# Altium footprint library Footprints.PcbLib: 45 footprints (part 3 of 3)
Each footprint in its own frame and in the unit in brackets; x right, y up, seen from the top. Pads: shape width x height; smd on the part's side, far side on the other; paste and mask are expansions set on the pad; w line width, h text height; cw(c..) or ccw(c..) is an arc to the next point about the centre after c.
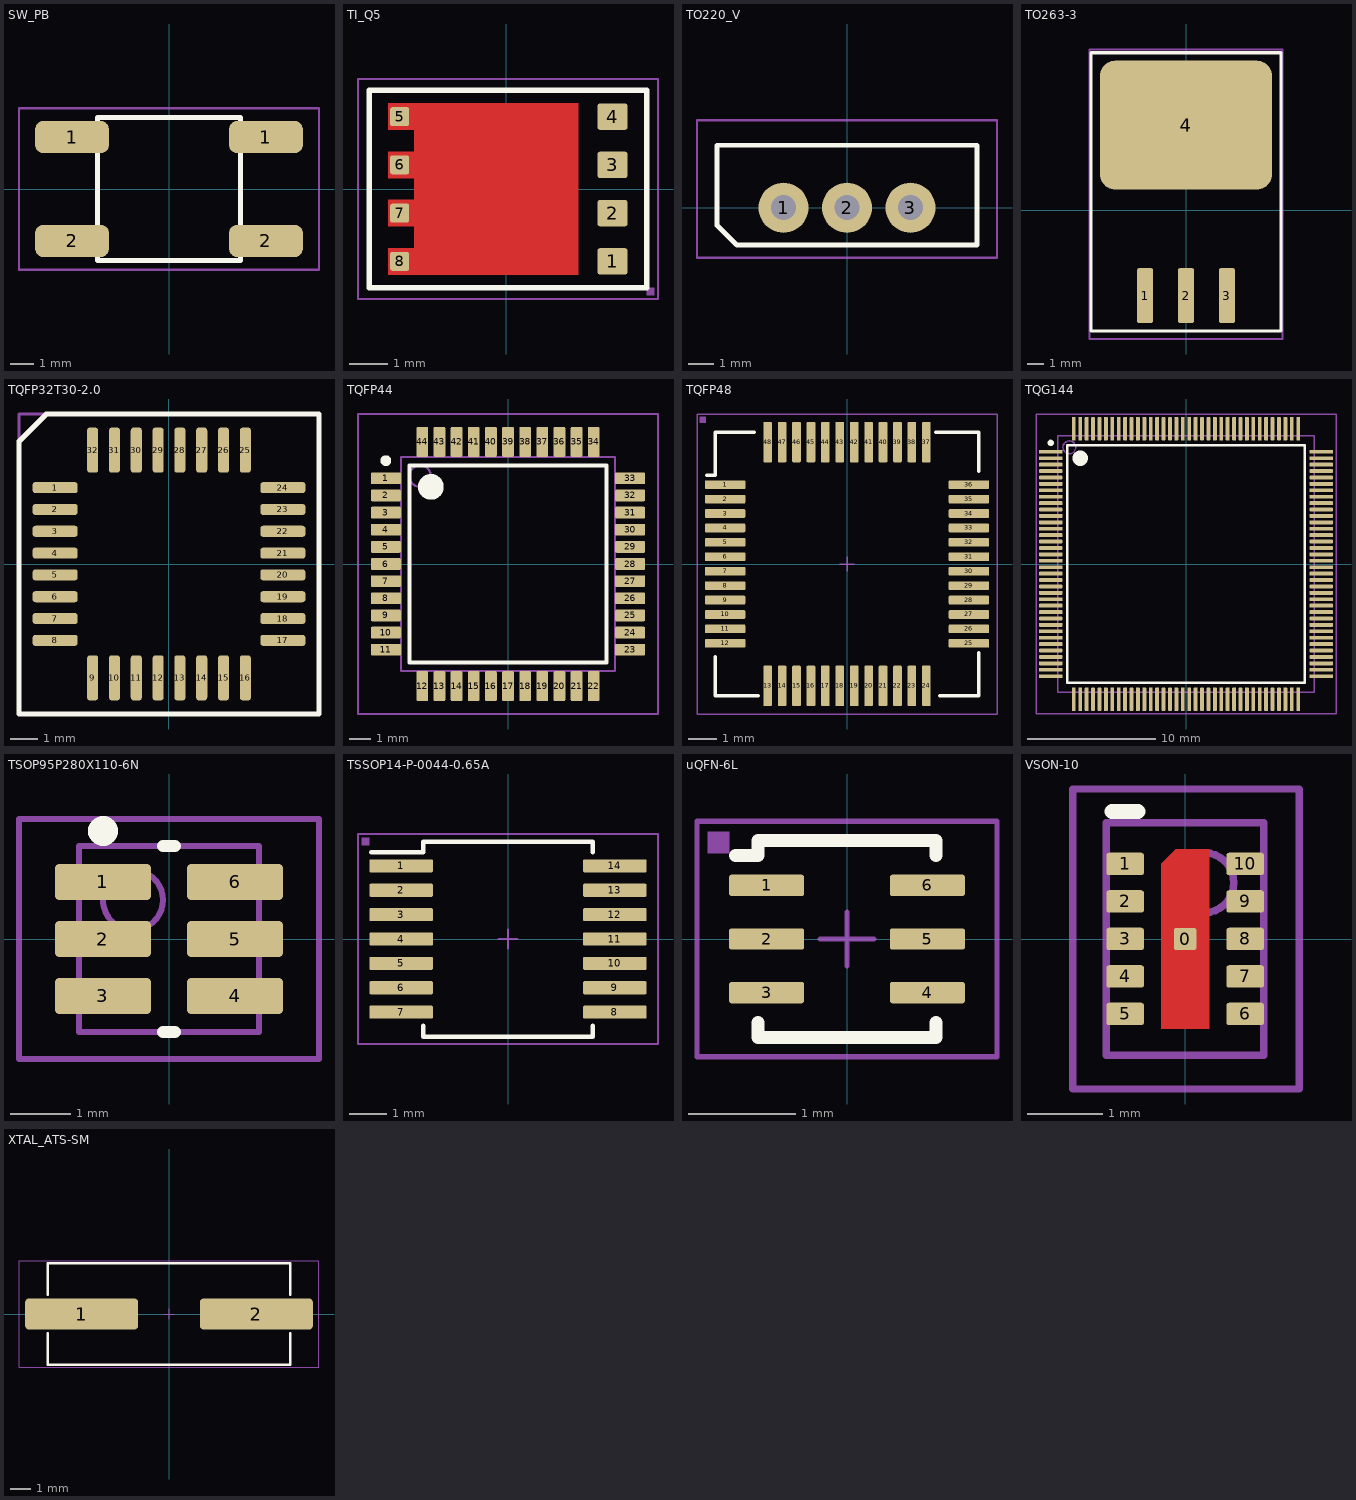
[diagram p2: the footprints below, top view; thin cyan lines are the x and y axes]

## SW_PB [mm]
pads (4):
  rrect50% 3.2x1.4 smd: 1(-4.2,2.25) 1(4.2,2.25) 2(-4.2,-2.25) 2(4.2,-2.25)
Top Overlay:
  lines w0.2: -3.1,-3.1 3.1,-3.1 3.1,3.1 -3.1,3.1 -3.1,-3.1
15. Courtyard TOP:
  lines w0.1: -6.5,-3.5 -6.5,3.5 6.5,3.5 6.5,-3.5 -6.5,-3.5
  text ".designator" at -1.5,-0.5 h1.5
  text "." at -2.4,2.2 h1
3D body: height 4.3, standoff 0, extent -1.488,-1.497 1.5,1.497
3D body: height 2.6, standoff 0, extent -3.1,-3.1 3.1,3.1

## TI_Q5 [mm] "Mosfet package"
pads (8):
  rrect23% 0.8x0.7 smd: 1(2.803,-1.905) 3(2.803,0.635) 4(2.803,1.905)
  rrect23% 0.8x0.7 smd paste+0: 2(2.803,-0.635)
  rrect23% 0.5x0.5 smd: 5(-2.802,1.905) 6(-2.802,0.635) 7(-2.802,-0.635) 8(-2.802,-1.905)
Top Layer:
  region: 1.898,2.255 1.898,-2.255 -3.102,-2.255 -3.102,-1.555 -2.422,-1.555 -2.422,-0.985 -3.102,-0.985 -3.102,-0.285 -2.422,-0.285 -2.422,0.285 -3.102,0.285 -3.102,0.985 -2.422,0.985 -2.422,1.555 -3.102,1.555 -3.102,2.255
Top Overlay:
  lines w0.15: -3.6,-2.6 3.7,-2.6 3.7,2.6 -3.6,2.6 -3.6,-2.6
15. Courtyard TOP:
  lines w0.05: -0.25,0 0.25,0 ; 0,-0.25 0,0.25 ; -3.9,-2.9 4,-2.9 4,2.9 -3.9,2.9 -3.9,-2.9
18. Assembly TOP:
  region: 3.9,-2.8 3.7,-2.8 3.7,-2.6 3.9,-2.6
  lines w0.05: -3.9,-2.9 -3.9,2.9 4,2.9 4,-2.9 -3.9,-2.9
  text ".designator" at -3.4,-0.7 h1.5
3D body: height 1.5, standoff 0, extent -3.5,-2.5 3.6,2.5

## TO220_V [mm]
height 16
pads (3):
  round 2 hole 1: 1(-2.54,0) 2(0,0) 3(2.54,0)
Top Overlay:
  lines w0.2: -5.2,-0.7 -4.4,-1.5 5.2,-1.5 5.2,2.5 -5.2,2.5 -5.2,-0.7
15. Courtyard TOP:
  lines w0.1: -6,-2 6,-2 6,3.5 -6,3.5 -6,-2
  text ".designator" at -1.6,0.1 h1
  text "." at -5.5,-1.5 h1
3D body: height 19.33, standoff -10, extent -5.607,-1.5 5.607,3.19

## TO263-3 [mm]
pads (4):
  rrect23% 1x3.4 smd: 1(-2.54,-5.3) 2(0,-5.3) 3(2.54,-5.3)
  rrect23% 10.7x8 smd: 4(0,5.3)
Top Overlay:
  lines w0.2: -5.9,-7.5 -5.9,9.8 5.9,9.8 5.9,-7.5 -3.1,-7.5 -5.9,-7.5
15. Courtyard TOP:
  lines w0.1: -6,-8 6,-8 6,10 -6,10 -6,-8
  text ".designator" at -0.5,0 h0.5
  text "." at -5,-7 h0.5

## TQFP32T30-2.0 [mm]
height 1.2
pads (32):
  rrect50% 1.65x0.406 smd: 1(-4.175,2.8) 2(-4.175,2) 3(-4.175,1.2) 4(-4.175,0.4) 5(-4.175,-0.4) 6(-4.175,-1.2) 7(-4.175,-2) 8(-4.175,-2.8) 17(4.175,-2.8) 18(4.175,-2) 19(4.175,-1.2) 20(4.175,-0.4) 21(4.175,0.4) 22(4.175,1.2) 23(4.175,2) 24(4.175,2.8)
  rrect50% 0.406x1.65 smd: 9(-2.8,-4.175) 10(-2,-4.175) 11(-1.2,-4.175) 12(-0.4,-4.175) 13(0.4,-4.175) 14(1.2,-4.175) 15(2,-4.175) 16(2.8,-4.175) 25(2.8,4.175) 26(2,4.175) 27(1.2,4.175) 28(0.4,4.175) 29(-0.4,4.175) 30(-1.2,4.175) 31(-2,4.175) 32(-2.8,4.175)
Top Overlay:
  lines w0.2: -5.5,-5.5 5.5,-5.5 5.5,5.5 -4.5,5.5 -5.5,4.5 -5.5,-5.5
15. Courtyard TOP:
  lines w0.1: -5.5,-5.5 -5.5,-5.5 ; -5.5,-5.5 -5.5,5.5 5.5,5.5 5.5,-5.5 -5.5,-5.5
  text ".designator" at -1.27,0 h1
  text "." at -4.4,2.7 h1
3D body: height 1.22, standoff 0.02, extent -4.599,-4.599 4.599,4.6

## TQFP44 [mm] "TQFP, 44-Leads, Body 10,00x10,00mm, Pitch 0,80mm, IPC Medium Density"
height 1.2
pads (44):
  rrect23% 1.4x0.55 smd mask+0.07: 1(-5.7,4) 2(-5.7,3.2) 3(-5.7,2.4) 4(-5.7,1.6) 5(-5.7,0.8) 6(-5.7,0) 7(-5.7,-0.8) 8(-5.7,-1.6) 9(-5.7,-2.4) 10(-5.7,-3.2) 11(-5.7,-4) 23(5.7,-4) 24(5.7,-3.2) 25(5.7,-2.4) 26(5.7,-1.6) 27(5.7,-0.8) 28(5.7,0) 29(5.7,0.8) 30(5.7,1.6) 31(5.7,2.4) 32(5.7,3.2) 33(5.7,4)
  rrect23% 0.55x1.4 smd mask+0.07: 12(-4,-5.7) 13(-3.2,-5.7) 14(-2.4,-5.7) 15(-1.6,-5.7) 16(-0.8,-5.7) 17(0,-5.7) 18(0.8,-5.7) 19(1.6,-5.7) 20(2.4,-5.7) 21(3.2,-5.7) 22(4,-5.7) 34(4,5.7) 35(3.2,5.7) 36(2.4,5.7) 37(1.6,5.7) 38(0.8,5.7) 39(0,5.7) 40(-0.8,5.7) 41(-1.6,5.7) 42(-2.4,5.7) 43(-3.2,5.7) 44(-4,5.7)
Top Overlay:
  circle w0.25: c-5.7,4.825 r0.125
  circle w0.6: c-3.6,3.6 r0.3
  lines w0.2: -4.6,-4.6 -4.6,4.6 4.6,4.6 4.6,-4.6 -4.6,-4.6
13. 3D Model TOP:
  circle w0.1: c-4.1,4.1 r0.5
  lines w0.1: -5,-5 -5,5 5,5 5,-5 -5,-5
15. Courtyard TOP:
  lines w0.1: -7,-7 -7,7 7,7 7,-7 -7,-7
  text ".designator" at -1.5,-0.5 h1
3D body: height 1.2, standoff 0.15, extent -5,-5 5,5

## TQFP48 [mm]
height 1.2
pads (48):
  rrect23% 1.4x0.3 smd mask+0.05: 1(-4.225,2.75) 2(-4.225,2.25) 3(-4.225,1.75) 4(-4.225,1.25) 5(-4.225,0.75) 6(-4.225,0.25) 7(-4.225,-0.25) 8(-4.225,-0.75) 9(-4.225,-1.25) 10(-4.225,-1.75) 11(-4.225,-2.25) 12(-4.225,-2.75) 25(4.225,-2.75) 26(4.225,-2.25) 27(4.225,-1.75) 28(4.225,-1.25) 29(4.225,-0.75) 30(4.225,-0.25) 31(4.225,0.25) 32(4.225,0.75) 33(4.225,1.25) 34(4.225,1.75) 35(4.225,2.25) 36(4.225,2.75)
  rrect23% 0.3x1.4 smd mask+0.05: 13(-2.75,-4.225) 14(-2.25,-4.225) 15(-1.75,-4.225) 16(-1.25,-4.225) 17(-0.75,-4.225) 18(-0.25,-4.225) 19(0.25,-4.225) 20(0.75,-4.225) 21(1.25,-4.225) 22(1.75,-4.225) 23(2.25,-4.225) 24(2.75,-4.225) 37(2.75,4.225) 38(2.25,4.225) 39(1.75,4.225) 40(1.25,4.225) 41(0.75,4.225) 42(0.25,4.225) 43(-0.25,4.225) 44(-0.75,4.225) 45(-1.25,4.225) 46(-1.75,4.225) 47(-2.25,4.225) 48(-2.75,4.225)
Top Overlay:
  lines w0.12: -4.87,3.08 -4.56,3.08 -4.56,4.56 -3.21,4.56 ; -4.56,-3.21 -4.56,-4.56 -3.08,-4.56 ; 3.08,4.56 4.56,4.56 4.56,3.21 ; 3.21,-4.56 4.56,-4.56 4.56,-3.08
15. Courtyard TOP:
  lines w0.05: -0.25,0 0.25,0 ; 0,-0.25 0,0.25 ; -5.2,-5.2 -5.2,5.2 5.2,5.2 5.2,-5.2 -5.2,-5.2
18. Assembly TOP:
  region: -5.1,5.1 -4.9,5.1 -4.9,4.9 -5.1,4.9
  lines w0.05: -5.2,-5.2 5.2,-5.2 5.2,5.2 -5.2,5.2 -5.2,-5.2
  text ".designator" at -3.4,-0.7 h1.5
3D body: height 1.48, standoff 0.02, extent -4.5,-4.5 4.5,4.5

## TQG144 [mm] "Thin QFP, 144-Leads, Body 20x20mm, Pitch 0.5mm, IPC Medium Density"
height 1.6
pads (144):
  rrect23% 1.8x0.3 smd mask+0.07: 1(-10.55,8.75) 2(-10.55,8.25) 3(-10.55,7.75) 4(-10.55,7.25) 5(-10.55,6.75) 6(-10.55,6.25) 7(-10.55,5.75) 8(-10.55,5.25) 9(-10.55,4.75) 10(-10.55,4.25) 11(-10.55,3.75) 12(-10.55,3.25) 13(-10.55,2.75) 14(-10.55,2.25) 15(-10.55,1.75) 16(-10.55,1.25) 17(-10.55,0.75) 18(-10.55,0.25) 19(-10.55,-0.25) 20(-10.55,-0.75) 21(-10.55,-1.25) 22(-10.55,-1.75) 23(-10.55,-2.25) 24(-10.55,-2.75) 25(-10.55,-3.25) 26(-10.55,-3.75) 27(-10.55,-4.25) 28(-10.55,-4.75) 29(-10.55,-5.25) 30(-10.55,-5.75) 31(-10.55,-6.25) 32(-10.55,-6.75) 33(-10.55,-7.25) 34(-10.55,-7.75) 35(-10.55,-8.25) 36(-10.55,-8.75) 73(10.55,-8.75) 74(10.55,-8.25) 75(10.55,-7.75) 76(10.55,-7.25) 77(10.55,-6.75) 78(10.55,-6.25) 79(10.55,-5.75) 80(10.55,-5.25) 81(10.55,-4.75) 82(10.55,-4.25) 83(10.55,-3.75) 84(10.55,-3.25) 85(10.55,-2.75) 86(10.55,-2.25) 87(10.55,-1.75) 88(10.55,-1.25) 89(10.55,-0.75) 90(10.55,-0.25) 91(10.55,0.25) 92(10.55,0.75) 93(10.55,1.25) 94(10.55,1.75) 95(10.55,2.25) 96(10.55,2.75) 97(10.55,3.25) 98(10.55,3.75) 99(10.55,4.25) 100(10.55,4.75) 101(10.55,5.25) 102(10.55,5.75) 103(10.55,6.25) 104(10.55,6.75) 105(10.55,7.25) 106(10.55,7.75) 107(10.55,8.25) 108(10.55,8.75)
  rrect23% 0.3x1.8 smd mask+0.07: 37(-8.75,-10.55) 38(-8.25,-10.55) 39(-7.75,-10.55) 40(-7.25,-10.55) 41(-6.75,-10.55) 42(-6.25,-10.55) 43(-5.75,-10.55) 44(-5.25,-10.55) 45(-4.75,-10.55) 46(-4.25,-10.55) 47(-3.75,-10.55) 48(-3.25,-10.55) 49(-2.75,-10.55) 50(-2.25,-10.55) 51(-1.75,-10.55) 52(-1.25,-10.55) 53(-0.75,-10.55) 54(-0.25,-10.55) 55(0.25,-10.55) 56(0.75,-10.55) 57(1.25,-10.55) 58(1.75,-10.55) 59(2.25,-10.55) 60(2.75,-10.55) 61(3.25,-10.55) 62(3.75,-10.55) 63(4.25,-10.55) 64(4.75,-10.55) 65(5.25,-10.55) 66(5.75,-10.55) 67(6.25,-10.55) 68(6.75,-10.55) 69(7.25,-10.55) 70(7.75,-10.55) 71(8.25,-10.55) 72(8.75,-10.55) 109(8.75,10.55) 110(8.25,10.55) 111(7.75,10.55) 112(7.25,10.55) 113(6.75,10.55) 114(6.25,10.55) 115(5.75,10.55) 116(5.25,10.55) 117(4.75,10.55) 118(4.25,10.55) 119(3.75,10.55) 120(3.25,10.55) 121(2.75,10.55) 122(2.25,10.55) 123(1.75,10.55) 124(1.25,10.55) 125(0.75,10.55) 126(0.25,10.55) 127(-0.25,10.55) 128(-0.75,10.55) 129(-1.25,10.55) 130(-1.75,10.55) 131(-2.25,10.55) 132(-2.75,10.55) 133(-3.25,10.55) 134(-3.75,10.55) 135(-4.25,10.55) 136(-4.75,10.55) 137(-5.25,10.55) 138(-5.75,10.55) 139(-6.25,10.55) 140(-6.75,10.55) 141(-7.25,10.55) 142(-7.75,10.55) 143(-8.25,10.55) 144(-8.75,10.55)
Top Overlay:
  circle w0.25: c-10.55,9.45 r0.125
  circle w0.6: c-8.25,8.25 r0.3
  lines w0.2: -9.25,-9.25 -9.25,9.25 9.25,9.25 9.25,-9.25 -9.25,-9.25
13. 3D Model TOP:
  circle w0.1: c-9.1,9.1 r0.5
  lines w0.1: -10,-10 -10,10 10,10 10,-10 -10,-10
15. Courtyard TOP:
  lines w0.1: -11.7,-11.7 -11.7,11.7 11.7,11.7 11.7,-11.7 -11.7,-11.7
  text ".designator" at -8.28,-2.362 h5
  text "." at -9.881,9.093 h5
3D body: height 1.6, standoff -0.15, extent -11,-11 11,11

## TSOP95P280X110-6N [mm] "TSOP, 6-Leads, Body 3,00x2,75mm, Pitch 0,95mm, IPC Medium Density"
height 1.1
pads (6):
  rrect23% 1.6x0.6 smd: 1(-1.1,0.95) 2(-1.1,0) 3(-1.1,-0.95) 4(1.1,-0.95) 5(1.1,0) 6(1.1,0.95)
Top Overlay:
  circle w0.25: c-1.1,1.8 r0.125
  lines w0.2: -0.1,-1.55 0.1,-1.55 ; -0.1,1.55 0.1,1.55
15. Courtyard TOP:
  lines w0.1: -2.5,-2 2.5,-2 2.5,2 -2.5,2 -2.5,-2
  text ".designator" at -1.5,-0.5 h1
  text "." at -2,1.5 h1
17. Comp.body:
  circle w0.1: c-0.6,0.65 r0.5
  lines w0.1: -1.5,-1.55 1.5,-1.55 1.5,1.55 -1.5,1.55 -1.5,-1.55
3D body: height 1.1, standoff 0.01, extent -1.5,-1.55 1.5,1.55

## TSSOP14-P-0044-0.65A [mm] "TSSOP, 14-Leads, Body 5.4x4.5mm (max), Pitch 0.65mm, IPC Medium Density"
height 1.2
pads (14):
  rrect23% 1.7x0.35 smd mask+0.1: 1(-2.85,1.95) 2(-2.85,1.3) 3(-2.85,0.65) 4(-2.85,0) 5(-2.85,-0.65) 6(-2.85,-1.3) 7(-2.85,-1.95) 8(2.85,-1.95) 9(2.85,-1.3) 10(2.85,-0.65) 11(2.85,0) 12(2.85,0.65) 13(2.85,1.3) 14(2.85,1.95)
Top Overlay:
  lines w0.12: -3.64,2.31 -2.26,2.31 -2.26,2.6 2.26,2.6 2.26,2.31 ; -2.26,-2.31 -2.26,-2.6 2.26,-2.6 2.26,-2.31
15. Courtyard TOP:
  lines w0.05: -0.25,0 0.25,0 ; 0,-0.25 0,0.25 ; -4,-2.8 -4,2.8 4,2.8 4,-2.8 -4,-2.8
18. Assembly TOP:
  region: -3.9,2.7 -3.7,2.7 -3.7,2.5 -3.9,2.5
  lines w0.05: -4,-2.8 4,-2.8 4,2.8 -4,2.8 -4,-2.8
  text ".designator" at -3.4,-0.7 h1.5
3D body: height 1.2, standoff 0, extent -3.2,-2.55 3.2,2.55

## uQFN-6L [mm] "uQFN-6L"
height 0.55
pads (6):
  rrect23% 0.7x0.2 smd: 1(-0.75,0.5) 2(-0.75,0) 3(-0.75,-0.5) 4(0.75,-0.5) 5(0.75,0) 6(0.75,0.5)
Top Overlay:
  lines w0.12: -1.04,0.78 -0.83,0.78 -0.83,0.92 0.83,0.92 0.83,0.78 ; -0.83,-0.78 -0.83,-0.92 0.83,-0.92 0.83,-0.78
15. Courtyard TOP:
  lines w0.05: -0.25,0 0.25,0 ; 0,-0.25 0,0.25 ; -1.4,-1.1 -1.4,1.1 1.4,1.1 1.4,-1.1 -1.4,-1.1
18. Assembly TOP:
  region: -1.3,1 -1.1,1 -1.1,0.8 -1.3,0.8
  lines w0.05: -1.4,-1.1 -1.4,1.1 1.4,1.1 1.4,-1.1 -1.4,-1.1
  text ".designator" at -1.275,-0.35 h0.7
3D body: height 0.55, standoff 0.02, extent -0.775,-0.875 0.775,0.875

## VSON-10 [mm] "VSON-10"
height 0.6
pads (11):
  rrect23% 0.3x0.3 smd: 0(0,0)
  rrect23% 0.5x0.3 smd: 1(-0.8,1) 2(-0.8,0.5) 3(-0.8,0) 4(-0.8,-0.5) 5(-0.8,-1) 6(0.8,-1) 7(0.8,-0.5) 8(0.8,0) 9(0.8,0.5) 10(0.8,1)
Top Layer:
  region: -0.32,-1.195 0.32,-1.195 0.32,1.195 -0.128,1.195 -0.32,1.004
Top Overlay:
  lines w0.2: -0.975,1.7 -0.625,1.7
15. Courtyard TOP:
  lines w0.1: -1.5,-2 -1.5,2 1.524,2 1.524,-2 -1.5,-2
  text "." at -1.05,1.55 h1
  text ".designator" at 0.483,-1.7 h1
17. Comp.body:
  circle w0.1: c0.25,0.75 r0.4
  lines w0.1: -1.05,-1.55 -1.05,1.55 1.05,1.55 1.05,-1.55 -1.05,-1.55
3D body: height 0.6, standoff 0.02, extent -1.05,-1.55 1.05,1.55

## XTAL_ATS-SM [mm] "Quartz Crystal"
height 4.3
pads (2):
  rrect23% 5.5x1.5 smd: 1(-4.25,0) 2(4.25,0)
Top Overlay:
  lines w0.12: -5.9,-0.93 -5.9,-2.47 5.9,-2.47 5.9,-0.93 ; -5.9,0.93 -5.9,2.47 5.9,2.47 5.9,0.93
15. Courtyard TOP:
  lines w0.05: -0.25,0 0.25,0 ; 0,-0.25 0,0.25 ; -7.3,-2.6 -7.3,2.6 7.3,2.6 7.3,-2.6 -7.3,-2.6
18. Assembly TOP:
  lines w0.05: -7.3,-2.6 -7.3,2.6 7.3,2.6 7.3,-2.6 -7.3,-2.6
  text ".designator" at -2.8,-0.7 h1.5
3D body: height 4.3, standoff 0, extent -6.4,-2.415 6.4,2.415